# Altium footprint library 2.00-DIP-SOP、SOIC、ESOP、TSSOP、ETSSOP封装.PcbLib: 179 footprints (part 9 of 12)
Each footprint in its own frame and in the unit in brackets; x right, y up, seen from the top. Pads: shape width x height; smd on the part's side, far side on the other; paste and mask are expansions set on the pad; w line width, h text height; cw(c..) or ccw(c..) is an arc to the next point about the centre after c.
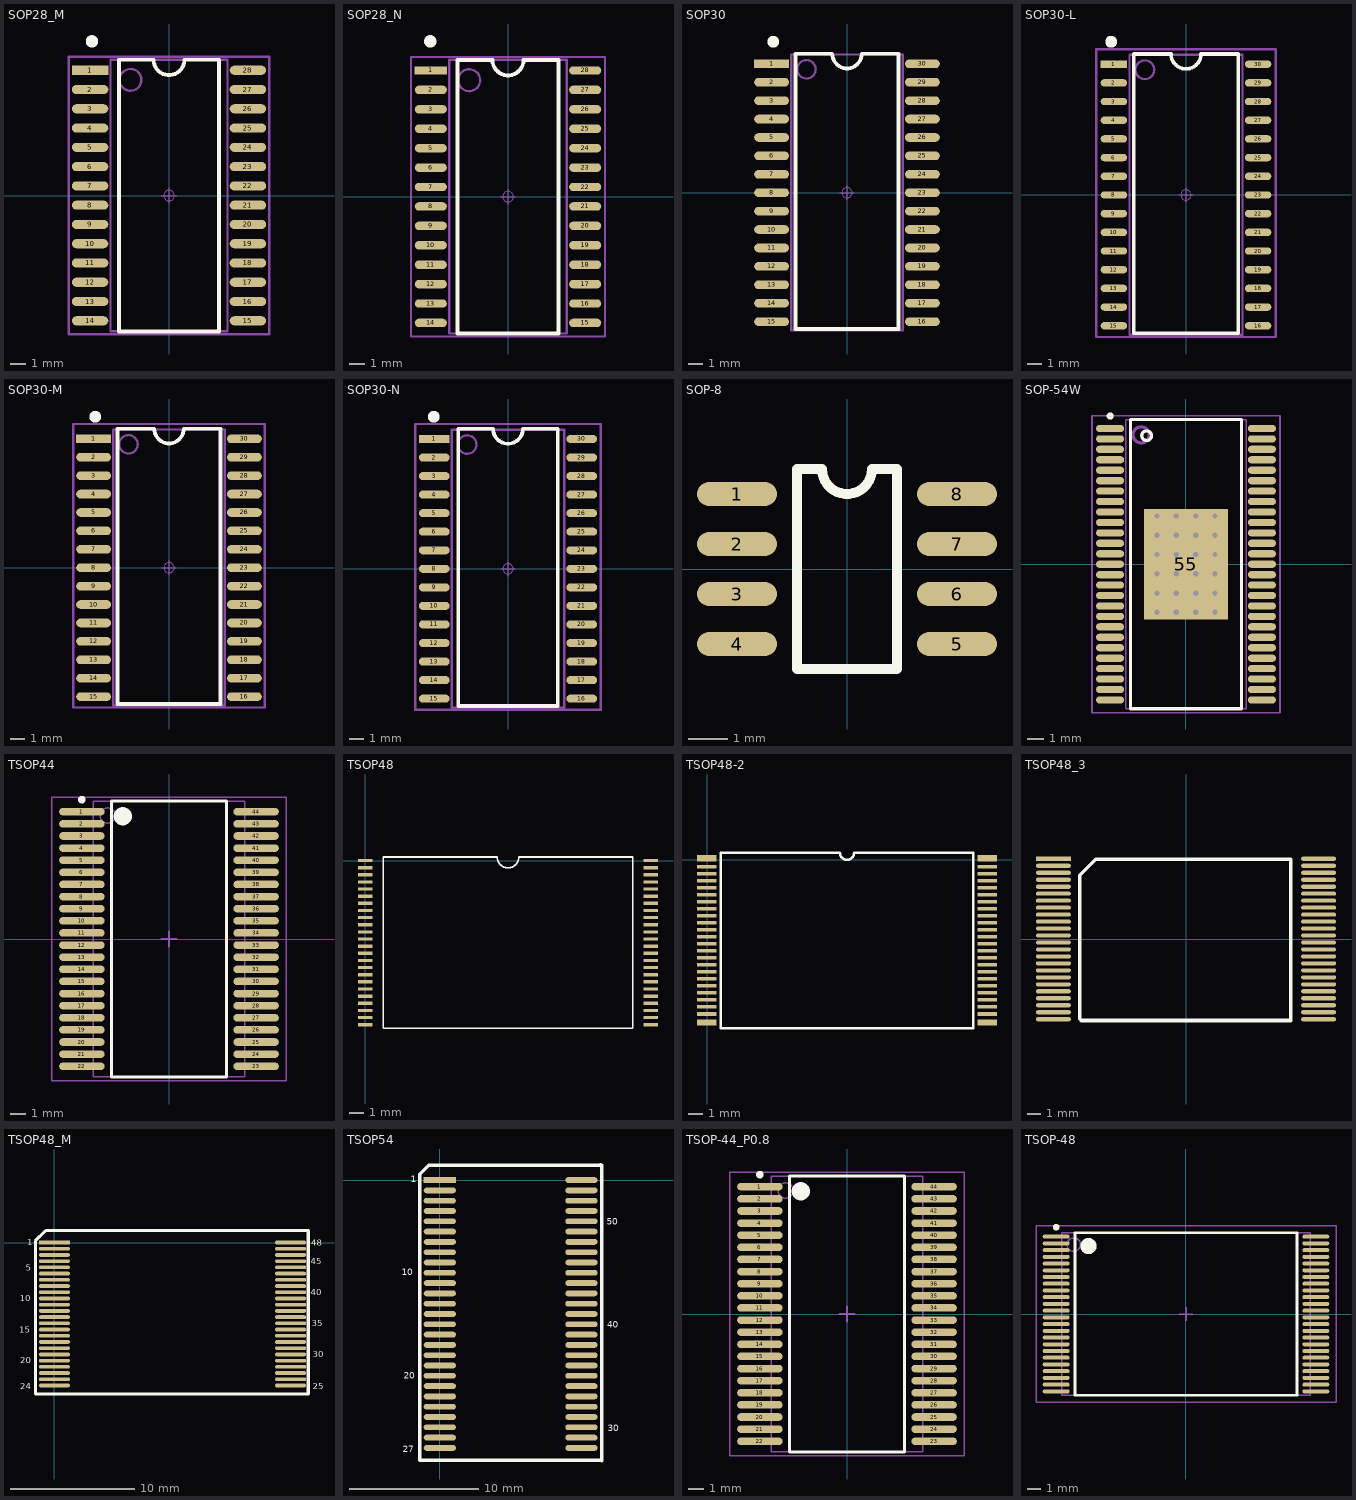
[diagram p8: the footprints below, top view; thin cyan lines are the x and y axes]

## SOP28_M [mm] "17.9*10.6*2.6mm（长宽高）"
pads (28):
  rect 2.4x0.6 smd: 1(-5.2,8.255)
  oval 2.4x0.6 smd: 2(-5.2,6.985) 3(-5.2,5.715) 4(-5.2,4.445) 5(-5.2,3.175) 6(-5.2,1.905) 7(-5.2,0.635) 8(-5.2,-0.635) 9(-5.2,-1.905) 10(-5.2,-3.175) 11(-5.2,-4.445) 12(-5.2,-5.715) 13(-5.2,-6.985) 14(-5.2,-8.255) 15(5.2,-8.255) 16(5.2,-6.985) 17(5.2,-5.715) 18(5.2,-4.445) 19(5.2,-3.175) 20(5.2,-1.905) 21(5.2,-0.635) 22(5.2,0.635) 23(5.2,1.905) 24(5.2,3.175) 25(5.2,4.445) 26(5.2,5.715) 27(5.2,6.985) 28(5.2,8.255)
Top Overlay:
  circle w0.5: c-5.08,10.16 r0.155
  lines w0.254: -3.302,-8.95 3.302,-8.95 3.302,8.95 1.016,8.95 cw(c0,8.95) -1.016,8.95 -3.302,8.95 -3.302,-8.95
Mechanical 13:
  circle w0.15: c-2.54,7.62 r0.718
  lines w0.15: -3.85,-8.95 -3.85,8.95 3.85,8.95 3.85,-8.95 -3.85,-8.95
Mechanical 15:
  circle w0.05: c0,0 r0.35
  lines w0.05: -0.5,0 0.5,0 ; 0,-0.5 0,0.5
  lines w0.15: -6.604,-9.144 6.604,-9.144 6.604,9.144 -6.604,9.144 -6.604,-9.144
3D body "SOP28-21_asm.STEP": height 2.7, standoff 0, extent -5.153,-8.95 5.153,8.95

## SOP28_N [mm] "17.9*10.6*2.6mm（长宽高）"
pads (28):
  rect 2.1x0.55 smd: 1(-5.05,8.255)
  oval 2.1x0.55 smd: 2(-5.05,6.985) 3(-5.05,5.715) 4(-5.05,4.445) 5(-5.05,3.175) 6(-5.05,1.905) 7(-5.05,0.635) 8(-5.05,-0.635) 9(-5.05,-1.905) 10(-5.05,-3.175) 11(-5.05,-4.445) 12(-5.05,-5.715) 13(-5.05,-6.985) 14(-5.05,-8.255) 15(5.05,-8.255) 16(5.05,-6.985) 17(5.05,-5.715) 18(5.05,-4.445) 19(5.05,-3.175) 20(5.05,-1.905) 21(5.05,-0.635) 22(5.05,0.635) 23(5.05,1.905) 24(5.05,3.175) 25(5.05,4.445) 26(5.05,5.715) 27(5.05,6.985) 28(5.05,8.255)
Top Overlay:
  circle w0.5: c-5.08,10.16 r0.155
  lines w0.254: -3.302,-8.95 3.302,-8.95 3.302,8.95 1.016,8.95 cw(c0,8.95) -1.016,8.95 -3.302,8.95 -3.302,-8.95
Mechanical 13:
  circle w0.15: c-2.54,7.62 r0.718
  lines w0.15: -3.85,-8.95 -3.85,8.95 3.85,8.95 3.85,-8.95 -3.85,-8.95
Mechanical 15:
  circle w0.05: c0,0 r0.35
  lines w0.05: -0.5,0 0.5,0 ; 0,-0.5 0,0.5
  lines w0.15: -6.35,-9.144 6.35,-9.144 6.35,-8.636 6.35,9.144 -6.35,9.144 -6.35,-9.144
3D body "SOP28-21_asm.STEP": height 2.7, standoff 0, extent -5.153,-8.95 5.153,8.95

## SOP30 [mm]
pads (30):
  rect 2.4x0.6 smd: 1(-5.2,8.89)
  oval 2.4x0.6 smd: 2(-5.2,7.62) 3(-5.2,6.35) 4(-5.2,5.08) 5(-5.2,3.81) 6(-5.2,2.54) 7(-5.2,1.27) 8(-5.2,0) 9(-5.2,-1.27) 10(-5.2,-2.54) 11(-5.2,-3.81) 12(-5.2,-5.08) 13(-5.2,-6.35) 14(-5.2,-7.62) 15(-5.2,-8.89) 16(5.2,-8.89) 17(5.2,-7.62) 18(5.2,-6.35) 19(5.2,-5.08) 20(5.2,-3.81) 21(5.2,-2.54) 22(5.2,-1.27) 23(5.2,0) 24(5.2,1.27) 25(5.2,2.54) 26(5.2,3.81) 27(5.2,5.08) 28(5.2,6.35) 29(5.2,7.62) 30(5.2,8.89)
Top Overlay:
  circle w0.5: c-5.08,10.414 r0.155
  lines w0.254: -3.556,-9.398 3.556,-9.398 3.556,9.585 1.016,9.585 cw(c0,9.585) -1.016,9.585 -3.556,9.585 -3.556,-9.398
Mechanical 13:
  circle w0.15: c-2.794,8.509 r0.635
  lines w0.15: -3.85,-9.5 -3.85,9.525 3.85,9.525 3.85,-9.5 -3.85,-9.5
Mechanical 15:
  circle w0.05: c0,0 r0.35
  lines w0.05: -0.5,0 0.5,0 ; 0,-0.5 0,0.5
3D body "SOP30.STEP": height 2.7, standoff 0, extent -5.153,-9.5 5.153,9.5

## SOP30-L [mm] "19*10.3*2.6mm（长宽高）            联系卖家 免费查找封装"
pads (30):
  rect 1.8x0.5 smd: 1(-4.9,8.89)
  oval 1.8x0.5 smd: 2(-4.9,7.62) 3(-4.9,6.35) 4(-4.9,5.08) 5(-4.9,3.81) 6(-4.9,2.54) 7(-4.9,1.27) 8(-4.9,0) 9(-4.9,-1.27) 10(-4.9,-2.54) 11(-4.9,-3.81) 12(-4.9,-5.08) 13(-4.9,-6.35) 14(-4.9,-7.62) 15(-4.9,-8.89) 16(4.9,-8.89) 17(4.9,-7.62) 18(4.9,-6.35) 19(4.9,-5.08) 20(4.9,-3.81) 21(4.9,-2.54) 22(4.9,-1.27) 23(4.9,0) 24(4.9,1.27) 25(4.9,2.54) 26(4.9,3.81) 27(4.9,5.08) 28(4.9,6.35) 29(4.9,7.62) 30(4.9,8.89)
Top Overlay:
  circle w0.5: c-5.08,10.414 r0.155
  lines w0.254: -3.556,-9.398 3.556,-9.398 3.556,9.585 1.016,9.585 cw(c0,9.585) -1.016,9.585 -3.556,9.585 -3.556,-9.398
Mechanical 13:
  circle w0.15: c-2.794,8.509 r0.635
  lines w0.15: -3.85,-9.5 -3.85,9.525 3.85,9.525 3.85,-9.5 -3.85,-9.5
Mechanical 15:
  circle w0.05: c0,0 r0.35
  lines w0.05: -0.5,0 0.5,0 ; 0,-0.5 0,0.5
  lines w0.15: -6.096,-9.652 -6.096,9.906 6.096,9.906 6.096,-9.652 -6.096,-9.652
3D body "SOP30.STEP": height 2.7, standoff 0, extent -5.153,-9.5 5.153,9.5

## SOP30-M [mm] "19*10.3*2.6mm（长宽高）            联系卖家 免费查找封装"
pads (30):
  rect 2.4x0.6 smd: 1(-5.2,8.89)
  oval 2.4x0.6 smd: 2(-5.2,7.62) 3(-5.2,6.35) 4(-5.2,5.08) 5(-5.2,3.81) 6(-5.2,2.54) 7(-5.2,1.27) 8(-5.2,0) 9(-5.2,-1.27) 10(-5.2,-2.54) 11(-5.2,-3.81) 12(-5.2,-5.08) 13(-5.2,-6.35) 14(-5.2,-7.62) 15(-5.2,-8.89) 16(5.2,-8.89) 17(5.2,-7.62) 18(5.2,-6.35) 19(5.2,-5.08) 20(5.2,-3.81) 21(5.2,-2.54) 22(5.2,-1.27) 23(5.2,0) 24(5.2,1.27) 25(5.2,2.54) 26(5.2,3.81) 27(5.2,5.08) 28(5.2,6.35) 29(5.2,7.62) 30(5.2,8.89)
Top Overlay:
  circle w0.5: c-5.08,10.414 r0.155
  lines w0.254: -3.556,-9.398 3.556,-9.398 3.556,9.585 1.016,9.585 cw(c0,9.585) -1.016,9.585 -3.556,9.585 -3.556,-9.398
Mechanical 13:
  circle w0.15: c-2.794,8.509 r0.635
  lines w0.15: -3.85,-9.5 -3.85,9.525 3.85,9.525 3.85,-9.5 -3.85,-9.5
Mechanical 15:
  circle w0.05: c0,0 r0.35
  lines w0.05: -0.5,0 0.5,0 ; 0,-0.5 0,0.5
  lines w0.15: -6.604,-9.652 6.604,-9.652 6.604,-8.89 6.604,9.906 -6.604,9.906 -6.604,-9.652
3D body "SOP30.STEP": height 2.7, standoff 0, extent -5.153,-9.5 5.153,9.5

## SOP30-N [mm] "19*10.3*2.6mm（长宽高）"
pads (30):
  rect 2.1x0.55 smd: 1(-5.05,8.89)
  oval 2.1x0.55 smd: 2(-5.05,7.62) 3(-5.05,6.35) 4(-5.05,5.08) 5(-5.05,3.81) 6(-5.05,2.54) 7(-5.05,1.27) 8(-5.05,0) 9(-5.05,-1.27) 10(-5.05,-2.54) 11(-5.05,-3.81) 12(-5.05,-5.08) 13(-5.05,-6.35) 14(-5.05,-7.62) 15(-5.05,-8.89) 16(5.05,-8.89) 17(5.05,-7.62) 18(5.05,-6.35) 19(5.05,-5.08) 20(5.05,-3.81) 21(5.05,-2.54) 22(5.05,-1.27) 23(5.05,0) 24(5.05,1.27) 25(5.05,2.54) 26(5.05,3.81) 27(5.05,5.08) 28(5.05,6.35) 29(5.05,7.62) 30(5.05,8.89)
Top Overlay:
  circle w0.5: c-5.08,10.414 r0.155
  lines w0.254: -3.4,-9.398 -3.4,9.585 -1.016,9.585 ccw(c0,9.585) 1.016,9.585 3.4,9.585 3.4,-9.398 -3.4,-9.398
Mechanical 13:
  circle w0.15: c-2.794,8.509 r0.635
  lines w0.15: -3.85,-9.5 -3.85,9.525 3.85,9.525 3.85,-9.5 -3.85,-9.5
Mechanical 15:
  circle w0.05: c0,0 r0.35
  lines w0.05: -0.5,0 0.5,0 ; 0,-0.5 0,0.5
  lines w0.15: -6.35,-9.652 6.35,-9.652 6.35,9.906 -6.35,9.906 -6.35,-9.652
3D body "SOP30.STEP": height 2.7, standoff 0, extent -5.153,-9.5 5.153,9.5

## SOP-8 [mil] "封装库来自淘宝卖家 ID：黄晶宝石"
height 39.37
pads (8):
  oval 80x24 smd: 1(-110,75) 2(-110,25) 3(-110,-25) 4(-110,-75) 5(110,-75) 6(110,-25) 7(110,25) 8(110,75)
Top Overlay:
  lines w10: -50,-100 -50,100 -25,100 ccw(c0,100) 25,100 50,100 50,-100 -50,-100
3D body "SOP8.STEP": height 74.8, standoff 0.03, extent -118.21,-98.42 118.23,98.43

## SOP-54W [mm] "MC33937,SOP, 54-Leads, Body 18.0x7.5mm (max), Pitch 0.65mm, IPC Medium Density"
height 2.45
pads (55):
  oval 1.75x0.45 smd: 1(-4.725,8.45) 2(-4.725,7.8) 3(-4.725,7.15) 4(-4.725,6.5) 5(-4.725,5.85) 6(-4.725,5.2) 7(-4.725,4.55) 8(-4.725,3.9) 9(-4.725,3.25) 10(-4.725,2.6) 11(-4.725,1.95) 12(-4.725,1.3) 13(-4.725,0.65) 14(-4.725,0) 15(-4.725,-0.65) 16(-4.725,-1.3) 17(-4.725,-1.95) 18(-4.725,-2.6) 19(-4.725,-3.25) 20(-4.725,-3.9) 21(-4.725,-4.55) 22(-4.725,-5.2) 23(-4.725,-5.85) 24(-4.725,-6.5) 25(-4.725,-7.15) 26(-4.725,-7.8) 27(-4.725,-8.45) 28(4.725,-8.45) 29(4.725,-7.8) 30(4.725,-7.15) 31(4.725,-6.5) 32(4.725,-5.85) 33(4.725,-5.2) 34(4.725,-4.55) 35(4.725,-3.9) 36(4.725,-3.25) 37(4.725,-2.6) 38(4.725,-1.95) 39(4.725,-1.3) 40(4.725,-0.65) 41(4.725,0) 42(4.725,0.65) 43(4.725,1.3) 44(4.725,1.95) 45(4.725,2.6) 46(4.725,3.25) 47(4.725,3.9) 48(4.725,4.55) 49(4.725,5.2) 50(4.725,5.85) 51(4.725,6.5) 52(4.725,7.15) 53(4.725,7.8) 54(4.725,8.45)
  rect 5.2x6.9 smd: 55(0,0)
via 1.8,-3 diameter 0.66 hole 0.33
via 0.6,-3 diameter 0.66 hole 0.33
via -0.6,-3 diameter 0.66 hole 0.33
via -1.8,-3 diameter 0.66 hole 0.33
via 1.8,-1.8 diameter 0.66 hole 0.33
via 0.6,-1.8 diameter 0.66 hole 0.33
via -0.6,-1.8 diameter 0.66 hole 0.33
via -1.8,-1.8 diameter 0.66 hole 0.33
via 1.8,-0.6 diameter 0.66 hole 0.33
via 0.6,-0.6 diameter 0.66 hole 0.33
via -0.6,-0.6 diameter 0.66 hole 0.33
via -1.8,-0.6 diameter 0.66 hole 0.33
via 1.8,0.6 diameter 0.66 hole 0.33
via 0.6,0.6 diameter 0.66 hole 0.33
via -0.6,0.6 diameter 0.66 hole 0.33
via -1.8,0.6 diameter 0.66 hole 0.33
via 1.8,1.8 diameter 0.66 hole 0.33
via 0.6,1.8 diameter 0.66 hole 0.33
via -0.6,1.8 diameter 0.66 hole 0.33
via -1.8,1.8 diameter 0.66 hole 0.33
via 1.8,3 diameter 0.66 hole 0.33
via 0.6,3 diameter 0.66 hole 0.33
via -0.6,3 diameter 0.66 hole 0.33
via -1.8,3 diameter 0.66 hole 0.33
Top Overlay:
  circle w0.2: c-2.45,8 r0.3
  circle w0.2: c-4.725,9.225 r0.125
  lines w0.2: -3.45,-9 3.45,-9 3.45,9 -3.45,9 -3.45,-9
Mechanical 13:
  circle w0.2: c-2.8,8.05 r0.5
  lines w0.1: -3.75,-9 3.75,-9 3.75,9 -3.75,9 -3.75,-9
Mechanical 15:
  lines w0.1: -0.5,0 0.5,0 ; 0,-0.5 0,0.5 ; -5.85,-9.25 5.85,-9.25 5.85,9.25 -5.85,9.25 -5.85,-9.25
3D body: height 2.45, standoff 0.1, extent -3.75,-9 3.75,9

## TSOP44 [mm] "TSOP"
height 1.2
pads (44):
  oval 3x0.5 smd: 1(-5.75,8.4) 2(-5.75,7.6) 3(-5.75,6.8) 4(-5.75,6) 5(-5.75,5.2) 6(-5.75,4.4) 7(-5.75,3.6) 8(-5.75,2.8) 9(-5.75,2) 10(-5.75,1.2) 11(-5.75,0.4) 12(-5.75,-0.4) 13(-5.75,-1.2) 14(-5.75,-2) 15(-5.75,-2.8) 16(-5.75,-3.6) 17(-5.75,-4.4) 18(-5.75,-5.2) 19(-5.75,-6) 20(-5.75,-6.8) 21(-5.75,-7.6) 22(-5.75,-8.4) 23(5.75,-8.4) 24(5.75,-7.6) 25(5.75,-6.8) 26(5.75,-6) 27(5.75,-5.2) 28(5.75,-4.4) 29(5.75,-3.6) 30(5.75,-2.8) 31(5.75,-2) 32(5.75,-1.2) 33(5.75,-0.4) 34(5.75,0.4) 35(5.75,1.2) 36(5.75,2) 37(5.75,2.8) 38(5.75,3.6) 39(5.75,4.4) 40(5.75,5.2) 41(5.75,6) 42(5.75,6.8) 43(5.75,7.6) 44(5.75,8.4)
Top Overlay:
  circle w0.6: c-3.05,8.1 r0.3
  circle w0.25: c-5.75,9.2 r0.125
  lines w0.2: -3.81,-9.1 3.81,-9.1 3.81,9.1 -3.81,9.1 -3.81,-9.1
Mechanical 13:
  circle w0.1: c-4.05,8.15 r0.5
  lines w0.1: -5,-9.1 5,-9.1 5,9.1 -5,9.1 -5,-9.1
Mechanical 15:
  lines w0.1: -0.5,0 0.5,0 ; 0,-0.5 0,0.5 ; -7.747,-9.35 7.747,-9.35 7.747,9.35 -7.747,9.35 -7.747,-9.35
3D body: height 1.2, standoff 0.2, extent -5,-9.1 5,9.1

## TSOP48 [mil]
pads (48):
  rect 40x9 smd: 1(0,0) 2(0,-19.68) 3(0,-39.37) 4(0,-59.05) 5(0,-78.74) 6(0,-98.43) 7(0,-118.11) 8(0,-137.8) 9(0,-157.48) 10(0,-177.17) 11(0,-196.85) 12(0,-216.54) 13(0,-236.22) 14(0,-255.91) 15(0,-275.59) 16(0,-295.28) 17(0,-314.96) 18(0,-334.65) 19(0,-354.33) 20(0,-374.02) 21(0,-393.7) 22(0,-413.39) 23(0,-433.07) 24(0,-452.76) 25(787.4,-452.76) 26(787.4,-433.07) 27(787.4,-413.39) 28(787.4,-393.7) 29(787.4,-374.02) 30(787.4,-354.33) 31(787.4,-334.65) 32(787.4,-314.96) 33(787.4,-295.28) 34(787.4,-275.59) 35(787.4,-255.91) 36(787.4,-236.22) 37(787.4,-216.54) 38(787.4,-196.85) 39(787.4,-177.17) 40(787.4,-157.48) 41(787.4,-137.8) 42(787.4,-118.11) 43(787.4,-98.43) 44(787.4,-78.74) 45(787.4,-59.05) 46(787.4,-39.37) 47(787.4,-19.68) 48(787.4,0)
Top Overlay:
  lines w5: 49.69,-462.6 737.72,-462.6 737.72,9.84 423.7,9.84 cw(c393.7,9.84) 363.7,9.84 49.69,9.84 49.69,-462.6
3D body "User Library-TSOP48.step": height 49.21, standoff -0.39, extent -1.96,-465.55 789.38,10.83

## TSOP48-2 [mm]
pads (48):
  rect 1.4x0.45 smd: 1(-0.021,0.108) 24(-0.021,-11.592) 25(19.979,-11.592) 48(19.979,0.108)
  rect 1.4x0.25 smd: 2(-0.021,-0.492) 3(-0.021,-0.992) 4(-0.021,-1.492) 5(-0.021,-1.992) 6(-0.021,-2.492) 7(-0.021,-2.992) 8(-0.021,-3.492) 9(-0.021,-3.992) 10(-0.021,-4.492) 11(-0.021,-4.992) 12(-0.021,-5.492) 13(-0.021,-5.992) 14(-0.021,-6.492) 15(-0.021,-6.992) 16(-0.021,-7.492) 17(-0.021,-7.992) 18(-0.021,-8.492) 19(-0.021,-8.992) 20(-0.021,-9.492) 21(-0.021,-9.992) 22(-0.021,-10.492) 23(-0.021,-10.992) 26(19.979,-10.992) 27(19.979,-10.492) 28(19.979,-9.992) 29(19.979,-9.492) 30(19.979,-8.992) 31(19.979,-8.492) 32(19.979,-7.992) 33(19.979,-7.492) 34(19.979,-6.992) 35(19.979,-6.492) 36(19.979,-5.992) 37(19.979,-5.492) 38(19.979,-4.992) 39(19.979,-4.492) 40(19.979,-3.992) 41(19.979,-3.492) 42(19.979,-2.992) 43(19.979,-2.492) 44(19.979,-1.992) 45(19.979,-1.492) 46(19.979,-0.992) 47(19.979,-0.492)
Top Overlay:
  lines w0.178: 0.975,-11.992 19,-11.992 19,0.508 10.479,0.508 cw(c9.979,0.508) 9.479,0.508 0.975,0.508 0.975,-11.992
3D body "User Library-TSOP48.step": height 1.25, standoff -0.01, extent -0.2,-11.775 19.9,0.325

## TSOP48_3 [mm]
pads (48):
  rect 2.5x0.3 smd: 1(-9.5,5.75)
  oval 2.5x0.3 smd: 2(-9.5,5.25) 3(-9.5,4.75) 4(-9.5,4.25) 5(-9.5,3.75) 6(-9.5,3.25) 7(-9.5,2.75) 8(-9.5,2.25) 9(-9.5,1.75) 10(-9.5,1.25) 11(-9.5,0.75) 12(-9.5,0.25) 13(-9.5,-0.25) 14(-9.5,-0.75) 15(-9.5,-1.25) 16(-9.5,-1.75) 17(-9.5,-2.25) 18(-9.5,-2.75) 19(-9.5,-3.25) 20(-9.5,-3.75) 21(-9.5,-4.25) 22(-9.5,-4.75) 23(-9.5,-5.25) 24(-9.5,-5.75) 25(9.5,-5.75) 26(9.5,-5.25) 27(9.5,-4.75) 28(9.5,-4.25) 29(9.5,-3.75) 30(9.5,-3.25) 31(9.5,-2.75) 32(9.5,-2.25) 33(9.5,-1.75) 34(9.5,-1.25) 35(9.5,-0.75) 36(9.5,-0.25) 37(9.5,0.25) 38(9.5,0.75) 39(9.5,1.25) 40(9.5,1.75) 41(9.5,2.25) 42(9.5,2.75) 43(9.5,3.25) 44(9.5,3.75) 45(9.5,4.25) 46(9.5,4.75) 47(9.5,5.25) 48(9.5,5.75)
Top Overlay:
  lines w0.254: -6.35,5.715 7.493,5.715 7.493,-5.842 -7.493,-5.842 -7.62,-5.715 -7.62,4.572 -6.477,5.715 -5.969,5.715
3D body "User Library-TSOP48.step": height 1.25, standoff -0.01, extent -9.975,-6.075 10.125,6.025

## TSOP48_M [mm]
pads (48):
  rect 2.5x0.3 smd: 1(0,0)
  oval 2.5x0.3 smd: 2(0,-0.5) 3(0,-1) 4(0,-1.5) 5(0,-2) 6(0,-2.5) 7(0,-3) 8(0,-3.5) 9(0,-4) 10(0,-4.5) 11(0,-5) 12(0,-5.5) 13(0,-6) 14(0,-6.5) 15(0,-7) 16(0,-7.5) 17(0,-8) 18(0,-8.5) 19(0,-9) 20(0,-9.5) 21(0,-10) 22(0,-10.5) 23(0,-11) 24(0,-11.5) 25(19,-11.5) 26(19,-11) 27(19,-10.5) 28(19,-10) 29(19,-9.5) 30(19,-9) 31(19,-8.5) 32(19,-8) 33(19,-7.5) 34(19,-7) 35(19,-6.5) 36(19,-6) 37(19,-5.5) 38(19,-5) 39(19,-4.5) 40(19,-4) 41(19,-3.5) 42(19,-3) 43(19,-2.5) 44(19,-2) 45(19,-1.5) 46(19,-1) 47(19,-0.5) 48(19,0)
Top Overlay:
  lines w0.254: -1.524,-12.192 20.244,-12.192 20.422,-12.192 20.422,0.965 -0.686,0.965 -1.524,0.127 -1.524,-12.192
  text "45" at 20.625,-1.753 h0.51
  text "48" at 20.676,-0.254 h0.51
  text "40" at 20.625,-4.242 h0.51
  text "35" at 20.701,-6.731 h0.51
  text "30" at 20.777,-9.22 h0.51
  text "25" at 20.777,-11.786 h0.51
  text "24" at -2.743,-11.811 h0.51
  text "20" at -2.743,-9.728 h0.51
  text "15" at -2.845,-7.264 h0.51
  text "10" at -2.769,-4.724 h0.51
  text "5" at -2.311,-2.286 h0.51
  text "1" at -2.184,-0.203 h0.51
3D body "User Library-TSOP48.step": height 1.25, standoff -0.01, extent -0.625,-11.8 19.475,0.3

## TSOP54 [mm]
pads (54):
  rect 2.5x0.45 smd: 1(0,0)
  oval 2.5x0.45 smd: 2(0,-0.8) 3(0,-1.6) 4(0,-2.4) 5(0,-3.2) 6(0,-4) 7(0,-4.8) 8(0,-5.6) 9(0,-6.4) 10(0,-7.2) 11(0,-8) 12(0,-8.8) 13(0,-9.6) 14(0,-10.4) 15(0,-11.2) 16(0,-12) 17(0,-12.8) 18(0,-13.6) 19(0,-14.4) 20(0,-15.2) 21(0,-16) 22(0,-16.8) 23(0,-17.6) 24(0,-18.4) 25(0,-19.2) 26(0,-20) 27(0,-20.8) 28(11,-20.8) 29(11,-20) 30(11,-19.2) 31(11,-18.4) 32(11,-17.6) 33(11,-16.8) 34(11,-16) 35(11,-15.2) 36(11,-14.4) 37(11,-13.6) 38(11,-12.8) 39(11,-12) 40(11,-11.2) 41(11,-10.4) 42(11,-9.6) 43(11,-8.8) 44(11,-8) 45(11,-7.2) 46(11,-6.4) 47(11,-5.6) 48(11,-4.8) 49(11,-4) 50(11,-3.2) 51(11,-2.4) 52(11,-1.6) 53(11,-0.8) 54(11,0)
Top Overlay:
  lines w0.254: 12.497,-21.768 -1.549,-21.768 -1.549,0.457 -0.864,1.143 12.421,1.143 12.497,1.219 ; 12.573,-21.819 12.573,1.168
  text "27" at -2.87,-21.133 h0.51
  text "20" at -2.819,-15.443 h0.51
  text "10" at -2.946,-7.391 h0.51
  text "1" at -2.261,-0.152 h0.51
  text "30" at 13.03,-19.507 h0.51
  text "40" at 13.005,-11.481 h0.51
  text "50" at 12.954,-3.454 h0.51

## TSOP-44_P0.8 [mm] "TSOP"
height 1.2
pads (44):
  oval 3x0.5 smd: 1(-5.75,8.4) 2(-5.75,7.6) 3(-5.75,6.8) 4(-5.75,6) 5(-5.75,5.2) 6(-5.75,4.4) 7(-5.75,3.6) 8(-5.75,2.8) 9(-5.75,2) 10(-5.75,1.2) 11(-5.75,0.4) 12(-5.75,-0.4) 13(-5.75,-1.2) 14(-5.75,-2) 15(-5.75,-2.8) 16(-5.75,-3.6) 17(-5.75,-4.4) 18(-5.75,-5.2) 19(-5.75,-6) 20(-5.75,-6.8) 21(-5.75,-7.6) 22(-5.75,-8.4) 23(5.75,-8.4) 24(5.75,-7.6) 25(5.75,-6.8) 26(5.75,-6) 27(5.75,-5.2) 28(5.75,-4.4) 29(5.75,-3.6) 30(5.75,-2.8) 31(5.75,-2) 32(5.75,-1.2) 33(5.75,-0.4) 34(5.75,0.4) 35(5.75,1.2) 36(5.75,2) 37(5.75,2.8) 38(5.75,3.6) 39(5.75,4.4) 40(5.75,5.2) 41(5.75,6) 42(5.75,6.8) 43(5.75,7.6) 44(5.75,8.4)
Top Overlay:
  circle w0.25: c-5.75,9.2 r0.125
  circle w0.6: c-3.05,8.1 r0.3
  lines w0.2: -3.81,-9.1 -3.81,9.1 3.81,9.1 3.81,-9.1 -3.81,-9.1
Mechanical 13:
  circle w0.1: c-4.05,8.15 r0.5
  lines w0.1: -5,-9.1 -5,9.1 5,9.1 5,-9.1 -5,-9.1
Mechanical 15:
  lines w0.1: -0.5,0 0.5,0 ; 0,-0.5 0,0.5 ; -7.747,-9.35 -7.747,9.35 7.747,9.35 7.747,-9.35 -7.747,-9.35
3D body: height 1.2, standoff 0.2, extent -5,-9.1 5,9.1

## TSOP-48 [mm]
height 1.2
pads (48):
  oval 2x0.3 smd: 1(-9.65,5.75) 2(-9.65,5.25) 3(-9.65,4.75) 4(-9.65,4.25) 5(-9.65,3.75) 6(-9.65,3.25) 7(-9.65,2.75) 8(-9.65,2.25) 9(-9.65,1.75) 10(-9.65,1.25) 11(-9.65,0.75) 12(-9.65,0.25) 13(-9.65,-0.25) 14(-9.65,-0.75) 15(-9.65,-1.25) 16(-9.65,-1.75) 17(-9.65,-2.25) 18(-9.65,-2.75) 19(-9.65,-3.25) 20(-9.65,-3.75) 21(-9.65,-4.25) 22(-9.65,-4.75) 23(-9.65,-5.25) 24(-9.65,-5.75) 25(9.65,-5.75) 26(9.65,-5.25) 27(9.65,-4.75) 28(9.65,-4.25) 29(9.65,-3.75) 30(9.65,-3.25) 31(9.65,-2.75) 32(9.65,-2.25) 33(9.65,-1.75) 34(9.65,-1.25) 35(9.65,-0.75) 36(9.65,-0.25) 37(9.65,0.25) 38(9.65,0.75) 39(9.65,1.25) 40(9.65,1.75) 41(9.65,2.25) 42(9.65,2.75) 43(9.65,3.25) 44(9.65,3.75) 45(9.65,4.25) 46(9.65,4.75) 47(9.65,5.25) 48(9.65,5.75)
Top Overlay:
  circle w0.25: c-9.65,6.45 r0.125
  circle w0.6: c-7.25,5.05 r0.3
  lines w0.2: -8.25,-6.05 -8.25,6.05 8.25,6.05 8.25,-6.05 -8.25,-6.05
Mechanical 13:
  circle w0.1: c-8.35,5.15 r0.5
  lines w0.1: -9.25,-6.05 -9.25,6.05 9.25,6.05 9.25,-6.05 -9.25,-6.05
Mechanical 15:
  lines w0.1: -0.5,0 0.5,0 ; 0,-0.5 0,0.5 ; -11.15,-6.55 -11.15,6.55 11.15,6.55 11.15,-6.55 -11.15,-6.55
3D body "User Library-TSOP48.step": height 1.25, standoff -0.01, extent -10.1,-6.05 10,6.05